# Altium integrated library KF2EDGK.IntLib: 15 symbols
Pins are listed as number, name and electrical type; pins without a type are passive.

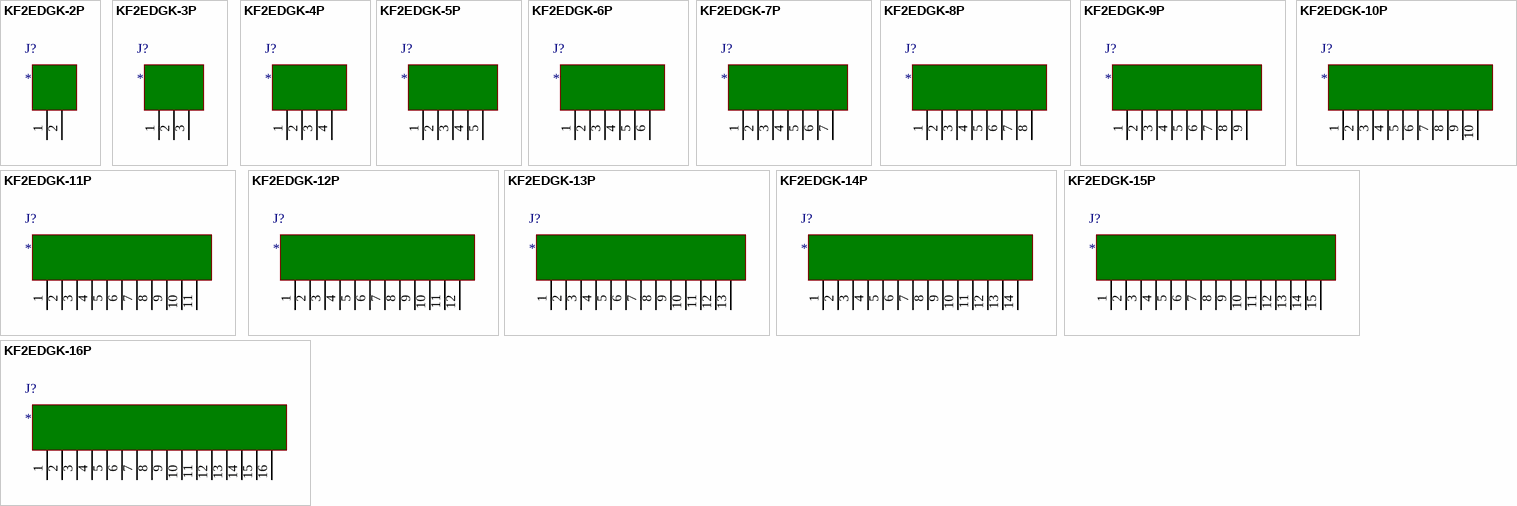
[diagram p0: symbols KF2EDGK-2P to KF2EDGK-16P]

## KF2EDGK-2P
designator J?
footprint KF2EDGK5.0-2P
footprint KF2EDGK-2.54-2P
footprint KF2EDGK-2.54W-2P
footprint KF2EDGK5.08-2P
footprint KF2EDGK5.08W-2P
footprint KF2EDGK-3.81W-2P
pins: 1, 2

## KF2EDGK-3P
designator J?
footprint KF2EDGK5.0-3P
footprint KF2EDGK5.0W-3P
footprint KF2EDGK5.08W-3P
footprint KF2EDGK-2.54-3P
footprint KF2EDGK-2.54W-3P
footprint KF2EDGK5.08-3P
pins: 1, 2, 3

## KF2EDGK-4P
designator J?
footprint KF2EDGK5.0-4P
footprint KF2EDGK5.0W-4P
footprint KF2EDGK5.08-4P (立插端)
footprint KF2EDGK5.08W-4P
footprint KF2EDGK-2.54-4P
footprint KF2EDGK-2.54W-4P
pins: 1, 2, 3, 4

## KF2EDGK-5P
designator J?
footprint KF2EDGK5.0-5P
footprint KF2EDGK5.0W-5P
footprint KF2EDGK5.08-5P
footprint KF2EDGK5.08W-5P
footprint KF2EDGK-2.54-5P
footprint KF2EDGK-2.54W-5P
pins: 1, 2, 3, 4, 5

## KF2EDGK-6P
designator J?
footprint KF2EDGK5.0-6P
footprint KF2EDGK5.0W-6P
footprint KF2EDGK5.08-6P
footprint KF2EDGK5.08W-6P
footprint KF2EDGK-2.54-6P
footprint KF2EDGK-2.54W-6P
pins: 1, 2, 3, 4, 5, 6

## KF2EDGK-7P
designator J?
footprint KF2EDGK5.0-7P
footprint KF2EDGK5.0W-7P
footprint KF2EDGK5.08-7P
footprint KF2EDGK5.08W-7P
footprint KF2EDGK-2.54-7P
footprint KF2EDGK-2.54W-7P
pins: 1, 2, 3, 4, 5, 6, 7

## KF2EDGK-8P
designator J?
footprint KF2EDGK5.0-8P
footprint KF2EDGK5.0W-8P
footprint KF2EDGK5.08-8P
footprint KF2EDGK5.08W-8P
footprint KF2EDGK-2.54W-8P
footprint KF2EDGK-2.54-8P
pins: 1, 2, 3, 4, 5, 6, 7, 8

## KF2EDGK-9P
designator J?
footprint KF2EDGK5.0-9P
footprint KF2EDGK5.0W-9P
footprint KF2EDGK5.08-9P
footprint KF2EDGK5.08W-9P
footprint KF2EDGK-2.54W-9P
footprint KF2EDGK-2.54-9P
pins: 1, 2, 3, 4, 5, 6, 7, 8, 9

## KF2EDGK-10P
designator J?
footprint KF2EDGK5.0-10P
footprint KF2EDGK5.0W-10P
footprint KF2EDGK5.08-10P
footprint KF2EDGK5.08W-10P
footprint KF2EDGK-2.54W-10P (长：27.3mm，宽：10.1mm，高：8.1mm)
footprint KF2EDGK-2.54-10P
pins: 1, 2, 3, 4, 5, 6, 7, 8, 9, 10

## KF2EDGK-11P
designator J?
footprint KF2EDGK5.0-11P
footprint KF2EDGK5.0W-11P
footprint KF2EDGK5.08-11P
footprint KF2EDGK5.08W-11P
footprint KF2EDGK-2.54-11P
footprint KF2EDGK-2.54W-11P
pins: 1, 2, 3, 4, 5, 6, 7, 8, 9, 10, 11

## KF2EDGK-12P
designator J?
footprint KF2EDGK5.0-12P
footprint KF2EDGK5.08-12P (立插端)
footprint KF2EDGK5.0W-12P
footprint KF2EDGK5.08W-12P
footprint KF2EDGK-2.54W-12P
footprint KF2EDGK-2.54-12P
pins: 1, 2, 3, 4, 5, 6, 7, 8, 9, 10, 11, 12

## KF2EDGK-13P
designator J?
footprint KF2EDGK5.0-13P
footprint KF2EDGK5.0W-13P
footprint KF2EDGK5.08-13P
footprint KF2EDGK5.08W-13P
footprint KF2EDGK-2.54W-13P
footprint KF2EDGK-2.54-13P
pins: 1, 2, 3, 4, 5, 6, 7, 8, 9, 10, 11, 12, 13

## KF2EDGK-14P
designator J?
footprint KF2EDGK5.0-14P
footprint KF2EDGK5.08-14P
footprint KF2EDGK5.0W-14P
footprint KF2EDGK5.08W-14P
footprint KF2EDGK-2.54W-14P
footprint KF2EDGK-2.54W-14P
pins: 1, 2, 3, 4, 5, 6, 7, 8, 9, 10, 11, 12, 13, 14

## KF2EDGK-15P
designator J?
footprint KF2EDGK5.0-15P
footprint KF2EDGK5.0W-15P
footprint KF2EDGK5.08W-15P
footprint KF2EDGK5.08-15P
footprint KF2EDGK-2.54W-15P
footprint KF2EDGK-2.54-15P
footprint Model Name (Model Description)
pins: 1, 2, 3, 4, 5, 6, 7, 8, 9, 10, 11, 12, 13, 14, 15

## KF2EDGK-16P
designator J?
footprint KF2EDGK-2.54-16P
footprint KF2EDGK-2.54W-16P
pins: 1, 2, 3, 4, 5, 6, 7, 8, 9, 10, 11, 12, 13, 14, 15, 16